# Altium footprint library Zmod.PcbLib: 229 footprints (part 1 of 15)
Each footprint in its own frame and in the unit in brackets; x right, y up, seen from the top. Pads: shape width x height; smd on the part's side, far side on the other; paste and mask are expansions set on the pad; w line width, h text height; cw(c..) or ccw(c..) is an arc to the next point about the centre after c.
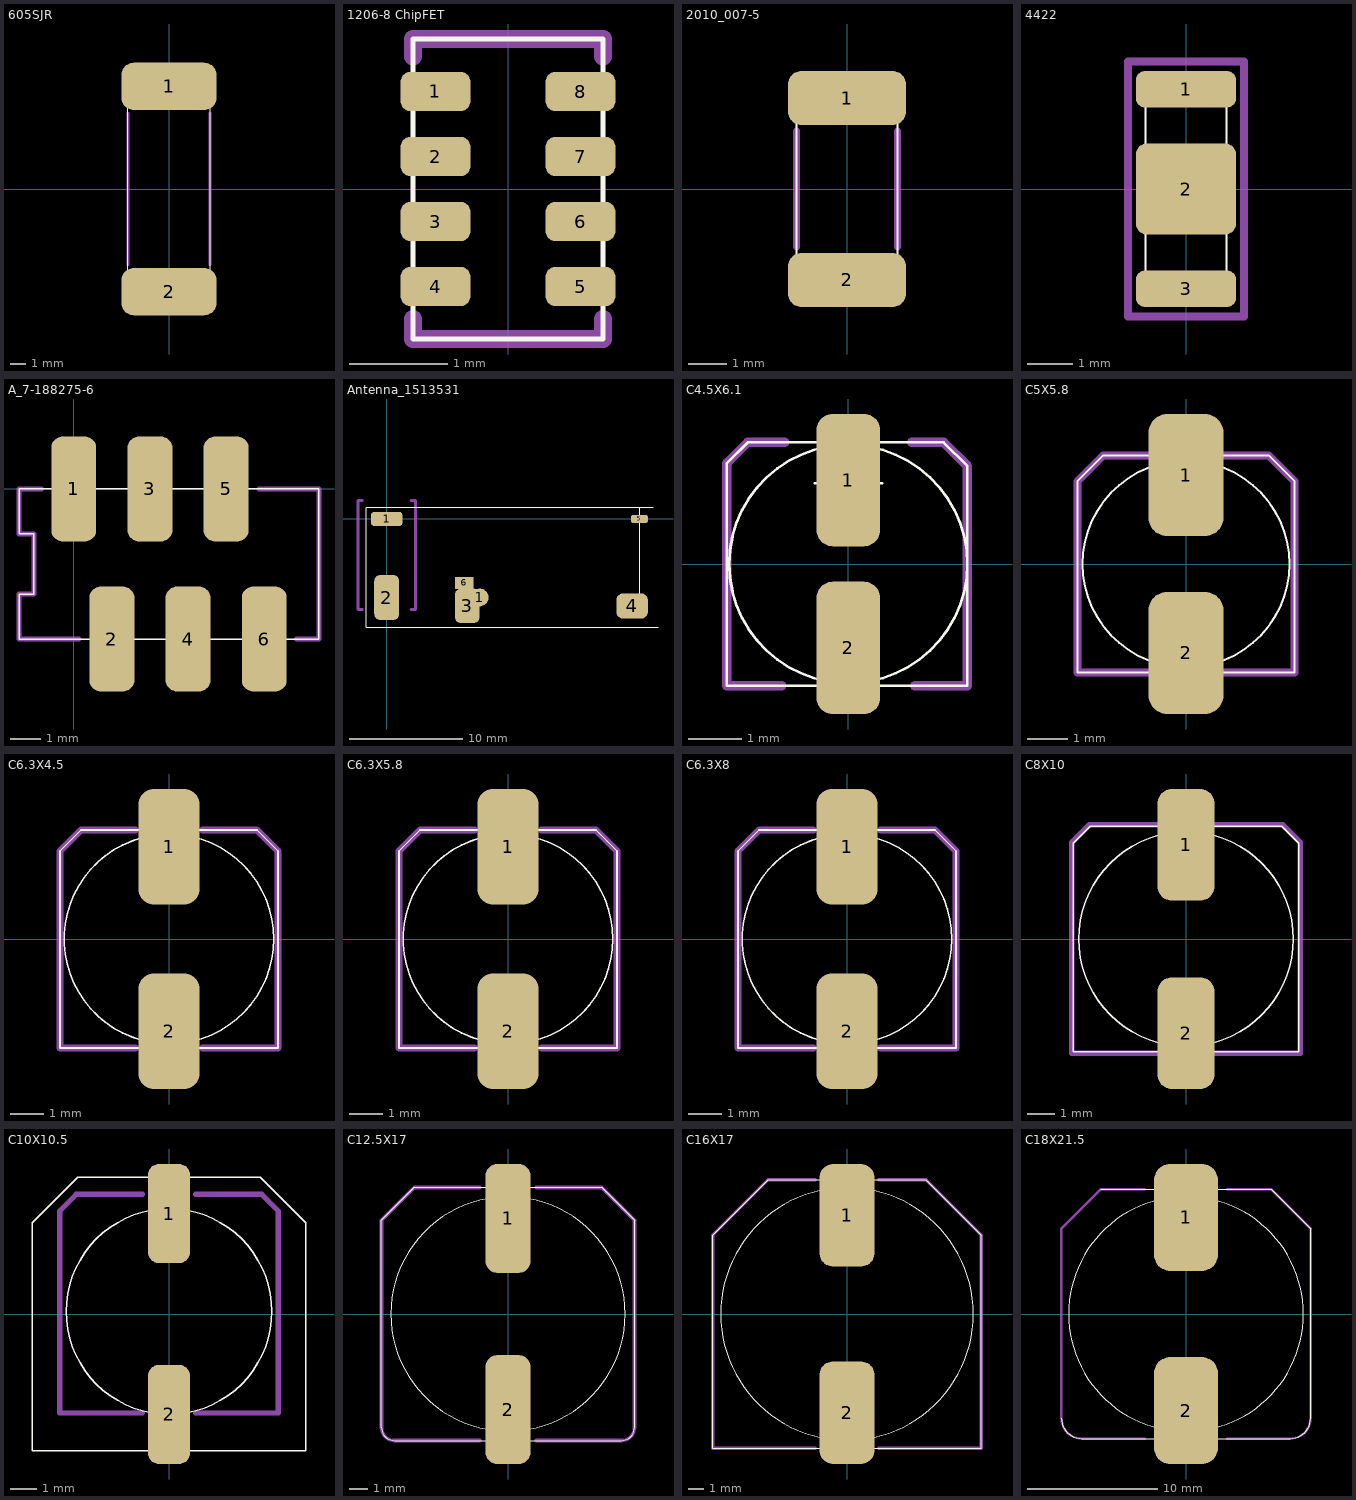
[diagram p0: the footprints below, top view; thin cyan lines are the x and y axes]

## 605SJR [mm] "Metal Alloy Current Sense 60S Series"
height 2
pads (2):
  rrect50% 6x3 smd: 1(0,6.5) 2(0,-6.5)
Top Overlay:
  lines w0.05: -2.6,-5.3 2.6,-5.3 ; -2.6,5.3 2.6,5.3 ; -2.6,-7 -2.6,7 2.6,7 2.6,-5.4 2.6,-7 -2.6,-7
Mechanical 15:
  lines w0.18: -2.6,-4.8 -2.6,4.8 ; 2.6,-4.8 2.6,4.8
  text ".Designator" at -0.5,-4.7 h1.5

## 1206-8 ChipFET [mm]
height 0.001
pads (8):
  rrect50% 0.71x0.4 smd: 1(-0.737,0.991) 2(-0.737,0.33) 3(-0.737,-0.33) 4(-0.737,-0.991) 5(0.737,-0.991) 6(0.737,-0.33) 7(0.737,0.33) 8(0.737,0.991)
Top Overlay:
  lines w0.05: -0.965,-1.118 -1.041,-1.118 -1.041,-0.864 -0.965,-0.864 ; -0.965,-0.457 -1.041,-0.457 -1.041,-0.203 -0.965,-0.203 ; -0.965,0.203 -1.041,0.203 -1.041,0.457 -0.965,0.457 ; -0.965,0.864 -1.041,0.864 -1.041,1.118 -0.965,1.118 ; 0.965,-1.118 1.041,-1.118 1.041,-0.864 0.965,-0.864 ; 0.965,-0.457 1.041,-0.457 1.041,-0.203 0.965,-0.203 ; 0.965,0.203 1.041,0.203 1.041,0.457 0.965,0.457 ; 0.965,0.864 1.041,0.864 1.041,1.118 0.965,1.118 ; -0.965,-1.524 0.965,-1.524 0.965,1.524 -0.965,1.524 -0.965,-1.524
Mechanical 15:
  lines w0.18: -0.965,-1.321 -0.965,-1.524 0.965,-1.524 0.965,-1.321 ; -0.965,1.346 -0.965,1.524 0.965,1.524 0.965,1.346
  text ".Designator" at 0.66,-1.499 h1.5

## 2010_007-5 [mm] "2010 Series 0.007 - 0.5 Ohms"
height 0.65
pads (2):
  rrect50% 3.05x1.4 smd: 1(0,2.35) 2(0,-2.35)
Top Overlay:
  lines w0.05: -1.3,-2.55 1.3,-2.55 1.3,2.55 -1.3,2.55 -1.3,-2.55
Mechanical 15:
  lines w0.18: -1.3,-1.5 -1.3,1.5 ; 1.3,-1.5 1.3,1.5
  text ".Designator" at 0.35,-2.65 h1.5

## 4422 [mm]
pads (3):
  rrect50% 2.2x0.8 smd: 1(0,2.184) 3(0,-2.184)
  rrect25% 2.2x2 smd: 2(0,0)
Top Overlay:
  lines w0.05: -0.889,-2.286 -0.889,2.286 0.889,2.286 0.889,-2.286 -0.889,-2.286
Mechanical 15:
  lines w0.178: -1.27,-2.794 1.27,-2.794 1.27,2.794 -1.27,2.794 -1.27,-2.794
  text ".Designator" at 0.254,-2.286 h1.5

## A_7-188275-6 [mm] "Amp 188275 series 2.54 mm pitch, 6 way, jack. Rev. 1"
height 5.3
pads (6):
  rrect50% 1.5x3.5 smd: 1(0,0) 2(1.27,-5) 3(2.54,0) 4(3.81,-5) 5(5.08,0) 6(6.35,-5)
Top Overlay:
  lines w0.05: -1.825,-5 8.175,-5 8.175,0 -1.825,0 -1.825,-1.5 -1.325,-1.5 -1.325,-3.5 -1.825,-3.5 -1.825,-5
Mechanical 15:
  lines w0.18: -1.075,0 -1.825,0 -1.825,-1.5 -1.325,-1.5 -1.325,-3.5 -1.825,-3.5 -1.825,-5 0.175,-5 ; 6.175,0 8.175,0 8.175,-5 7.425,-5
  text ".Designator" at -0.825,-3 h1.5

## Antenna_1513531 [mm]
pads (7):
  rrect50% 2.794x1.27 smd: 1(0,0)
  round 1.578 all layers, no hole: 1(8.225,-6.95)
  rrect50% 2.21x4.01 smd: 2(0,-6.952)
  rrect50% 2.2x3.056 smd: 3(7.127,-7.692)
  rrect50% 2.794x2.21 smd: 4(21.709,-7.701)
  rrect50% 1.5x0.71 smd: 5(22.351,0)
  rect 1.613x1.059 all layers, no hole: 6(6.85,-5.65)
Top Overlay:
  lines w0.05: -1.8,1 -1.8,-9.6 24,-9.6 ; -1.8,1.02 23.575,1.02 ; 22.4,-8.676 22.4,0.976
Mechanical 15:
  lines w0.25: -2.159,-8.026 -2.54,-8.026 -2.54,1.626 -2.159,1.626 ; 2.159,-8.026 2.54,-8.026 2.54,1.626 2.159,1.626
  text ".Designator" at -0.762,-7.899 h1.5

## C4.5X6.1 [mm] "Panasonic size B, EEEFK1 Series, Rev. 1"
height 6.1
pads (2):
  rrect50% 1.2x2.5 smd: 1(0,1.584) 2(0,-1.584)
Top Overlay:
  circle w0.05: c0,0 r2.25
  lines w0.05: -0.635,1.524 0.635,1.524 ; 0,0.889 0,2.159 ; -2.3,-2.3 -2.3,1.9 -1.9,2.3 1.8,2.3 2.25,1.85 2.25,-2.3 -2.3,-2.3
Mechanical 15:
  lines w0.18: -1.256,-2.3 -2.3,-2.3 -2.3,1.9 -2.268,1.932 -1.9,2.3 -1.2,2.3 ; 1.2,2.3 1.8,2.3 2.25,1.85 2.25,-2.3 1.256,-2.3
  text "+" at 1.016,0.635 h1.5
  text ".Designator" at 0.438,-6.52 h1.5

## C5X5.8 [mm]
height 5.8
pads (2):
  rrect50% 1.85x3 smd: 1(0,2.184) 2(0,-2.184)
Top Overlay:
  circle w0.05: c0,0 r2.54
  lines w0.05: -0.635,1.524 0.635,1.524 ; 0,0.889 0,2.159 ; -2.667,-2.667 -2.667,2.032 -2.032,2.667 2.032,2.667 2.667,2.032 2.667,-2.667 -2.667,-2.667
Mechanical 15:
  lines w0.2: -0.889,-2.667 -2.667,-2.667 -2.667,2.032 -2.032,2.667 -0.889,2.667 ; 0.889,-2.667 2.667,-2.667 2.667,2.032 2.032,2.667 0.889,2.667
  text ".Designator" at -0.762,-7.62 h1.5
  text "+" at 1.016,0.635 h1.5

## C6.3X4.5 [mm]
height 4.5
pads (2):
  rrect50% 1.85x3.5 smd paste+0: 1(0,2.794) 2(0,-2.794)
Top Overlay:
  circle w0.05: c0,0 r3.175
  circle w0.05: c0,0 r3.175
  lines w0.05: -0.635,2.159 0.635,2.159 ; 0,1.524 0,2.794 ; -3.302,-3.302 3.302,-3.302 3.302,2.667 2.667,3.302 -2.667,3.302 -3.302,2.667 -3.302,-3.302
Mechanical 15:
  lines w0.2: -1.016,-3.302 -3.302,-3.302 -3.302,2.667 -2.667,3.302 -1.016,3.302 ; 1.016,-3.302 3.302,-3.302 3.302,2.667 2.667,3.302 1.016,3.302
  text "+" at 1.27,1.27 h1.5
  text ".Designator" at -1.397,-7.62 h1.5

## C6.3X5.8 [mm] "Rev.1"
height 5.8
pads (2):
  rrect50% 1.85x3.5 smd paste+0: 1(0,2.794) 2(0,-2.794)
Top Overlay:
  circle w0.05: c0,0 r3.175
  lines w0.05: -0.635,2.159 0.635,2.159 ; 0,1.524 0,2.794 ; -3.302,-3.302 -3.302,2.667 -2.667,3.302 2.667,3.302 3.302,2.667 3.302,-3.302 -3.302,-3.302
Mechanical 15:
  lines w0.2: -1.016,-3.302 -3.302,-3.302 -3.302,2.667 -2.667,3.302 -1.016,3.302 ; 1.016,-3.302 3.302,-3.302 3.302,2.667 2.667,3.302 1.016,3.302
  text ".Designator" at -1.651,-7.62 h1.5
  text "+" at 1.397,1.397 h1.5

## C6.3X8 [mm]
height 8
pads (2):
  rrect50% 1.85x3.5 smd paste+0: 1(0,2.794) 2(0,-2.794)
Top Overlay:
  circle w0.05: c0,0 r3.175
  lines w0.05: -0.635,2.159 0.635,2.159 ; 0,1.524 0,2.794 ; -3.302,-3.302 3.302,-3.302 3.302,2.667 2.667,3.302 -2.667,3.302 -3.302,2.667 -3.302,-3.302
Mechanical 15:
  lines w0.2: -1.016,-3.302 -3.302,-3.302 -3.302,2.667 -2.667,3.302 -1.016,3.302 ; 1.016,-3.302 3.302,-3.302 3.302,2.667 2.667,3.302 1.016,3.302
  text "+" at 1.397,1.397 h1.5
  text ".Designator" at -1.651,-7.62 h1.5

## C8X10 [mm]
height 10
pads (2):
  rrect50% 2.1x4.1 smd paste+0: 1(0,3.454) 2(0,-3.454)
Top Overlay:
  circle w0.05: c0,0 r3.937
  lines w0.05: -0.635,3.175 0.635,3.175 ; 0,2.54 0,3.81 ; -4.14,-4.14 -4.14,3.505 -3.505,4.14 3.505,4.14 4.14,3.505 4.14,-4.14 -4.14,-4.14
Mechanical 15:
  lines w0.2: -1.016,-4.191 -4.191,-4.191 -4.191,3.556 -3.556,4.191 -1.016,4.191 ; 1.016,-4.191 4.191,-4.191 4.191,3.556 3.556,4.191 1.016,4.191
  text "+" at 1.905,2.032 h1.5
  text ".Designator" at -2.286,-7.62 h1.5

## C10X10.5 [mm] "REV 1"
height 10.5
pads (2):
  rrect50% 1.6x3.8 smd paste+0: 1(0,3.85) 2(0,-3.85)
Top Overlay:
  circle w0.05: c0,0.096 r3.937
  lines w0.05: -0.635,3.571 0.635,3.571 ; 0,2.936 0,4.206 ; -5.25,-5.25 5.25,-5.25 5.25,3.5 3.5,5.25 -3.5,5.25 -5.25,3.5 -5.25,-5.25
Mechanical 15:
  lines w0.2: -1.016,-3.795 -4.191,-3.795 -4.191,3.952 -3.556,4.587 -1.016,4.587 ; 1.016,-3.795 4.191,-3.795 4.191,3.952 3.556,4.587 1.016,4.587
  text ".Designator" at -2.286,-7.224 h1.5
  text "+" at 1.905,2.428 h1.5

## C12.5X17 [mm]
height 17
pads (2):
  rrect50% 2.4x5.8 smd paste+0: 1(0,5.1) 2(0,-5.1)
Top Overlay:
  circle w0.05: c0,0 r6.25
  lines w0.05: -1,5 1,5 ; -0.7,-6.75 -0.7,-7.25 0.7,-7.25 0.7,-6.75 ; -0.7,6.75 -0.7,7.25 0.7,7.25 0.7,6.75 ; 0,4 0,6 ; -6.75,-6.05 ccw(c-6.05,-6.05) -6.05,-6.75 6.05,-6.75 ccw(c6.05,-6.05) 6.75,-6.05 6.75,5 5,6.75 -5,6.75 -6.75,5 -6.75,-6.05
Mechanical 15:
  lines w0.178: -6.75,-6.05 ccw(c-6.05,-6.05) -6.05,-6.75 ; 6.05,-6.75 ccw(c6.05,-6.05) 6.75,-6.05
  lines w0.2: -6.75,-6.05 -6.75,5 -5,6.75 -1.5,6.75 ; -6.05,-6.75 -1.5,-6.75 ; 1.5,-6.75 6.05,-6.75 ; 1.5,6.75 5,6.75 6.75,5 6.75,-6.05
  text ".Designator" at -4.191,-7.62 h1.5
  text "+" at 3.048,3.81 h1.5

## C16X17 [mm]
height 17
pads (2):
  rrect50% 3.5x6.5 smd paste+0: 1(0,6.25) 2(0,-6.25)
Top Overlay:
  circle w0.05: c0,0 r8
  lines w0.05: -1.5,6 1.5,6 ; -0.75,-8.5 -0.75,-8.85 0.75,-8.85 0.75,-8.5 ; -0.75,8.5 -0.75,8.85 0.75,8.85 0.75,8.5 ; 0,4.5 0,7.5 ; -8.5,-8.5 -8.5,5 -5,8.5 5,8.5 8.5,5 8.5,-8.5 -8.5,-8.5
Mechanical 15:
  lines w0.2: -2,-8.5 -8.5,-8.5 -8.5,5 -5,8.5 -2,8.5 ; 2,-8.5 8.5,-8.5 8.5,5 5,8.5 2,8.5
  text ".Designator" at -4.699,-7.493 h1.5
  text "+" at 3.302,5.207 h1.5

## C18X21.5 [mm]
height 21
pads (2):
  rrect50% 4.9x8.2 smd paste+0: 1(0,7.4) 2(0,-7.4)
Top Overlay:
  circle w0.05: c0,0 r9
  lines w0.05: -9.55,-8 ccw(c-8,-8) -8,-9.55 8,-9.55 ccw(c8,-8) 9.55,-8 9.55,6.55 6.55,9.55 -6.55,9.55 ; -2,-9.55 -2,-10.75 2,-10.75 2,-9.55 ; -2,9.55 -2,10.75 2,10.75 2,9.55 ; -0.9,7.1 1.1,7.1 ; 0.1,6.1 0.1,8.1
Mechanical 15:
  lines w0.178: -9.55,-8 ccw(c-8,-8) -8,-9.55 ; 8,-9.55 ccw(c8,-8) 9.55,-8
  lines w0.2: -8,-9.55 -3.15,-9.55 ; -3.15,9.55 -6.55,9.55 ; 3.15,-9.55 8,-9.55 ; 3.15,9.55 6.55,9.55 9.55,6.55 9.55,-8 ; -9.55,6.55 -6.55,9.55 ; -9.55,6.55 -6.55,9.55 ; -9.55,6.55 -9.55,-8 -9.55,6.55
  text "+" at 4.572,6.223 h1.5
  text ".Designator" at -5.842,-7.747 h1.5